# Altium schematic symbol library IC_Maxim.SchLib: 843 symbols (part 17 of 20) (continued)
## MAX8543EEE (continued)
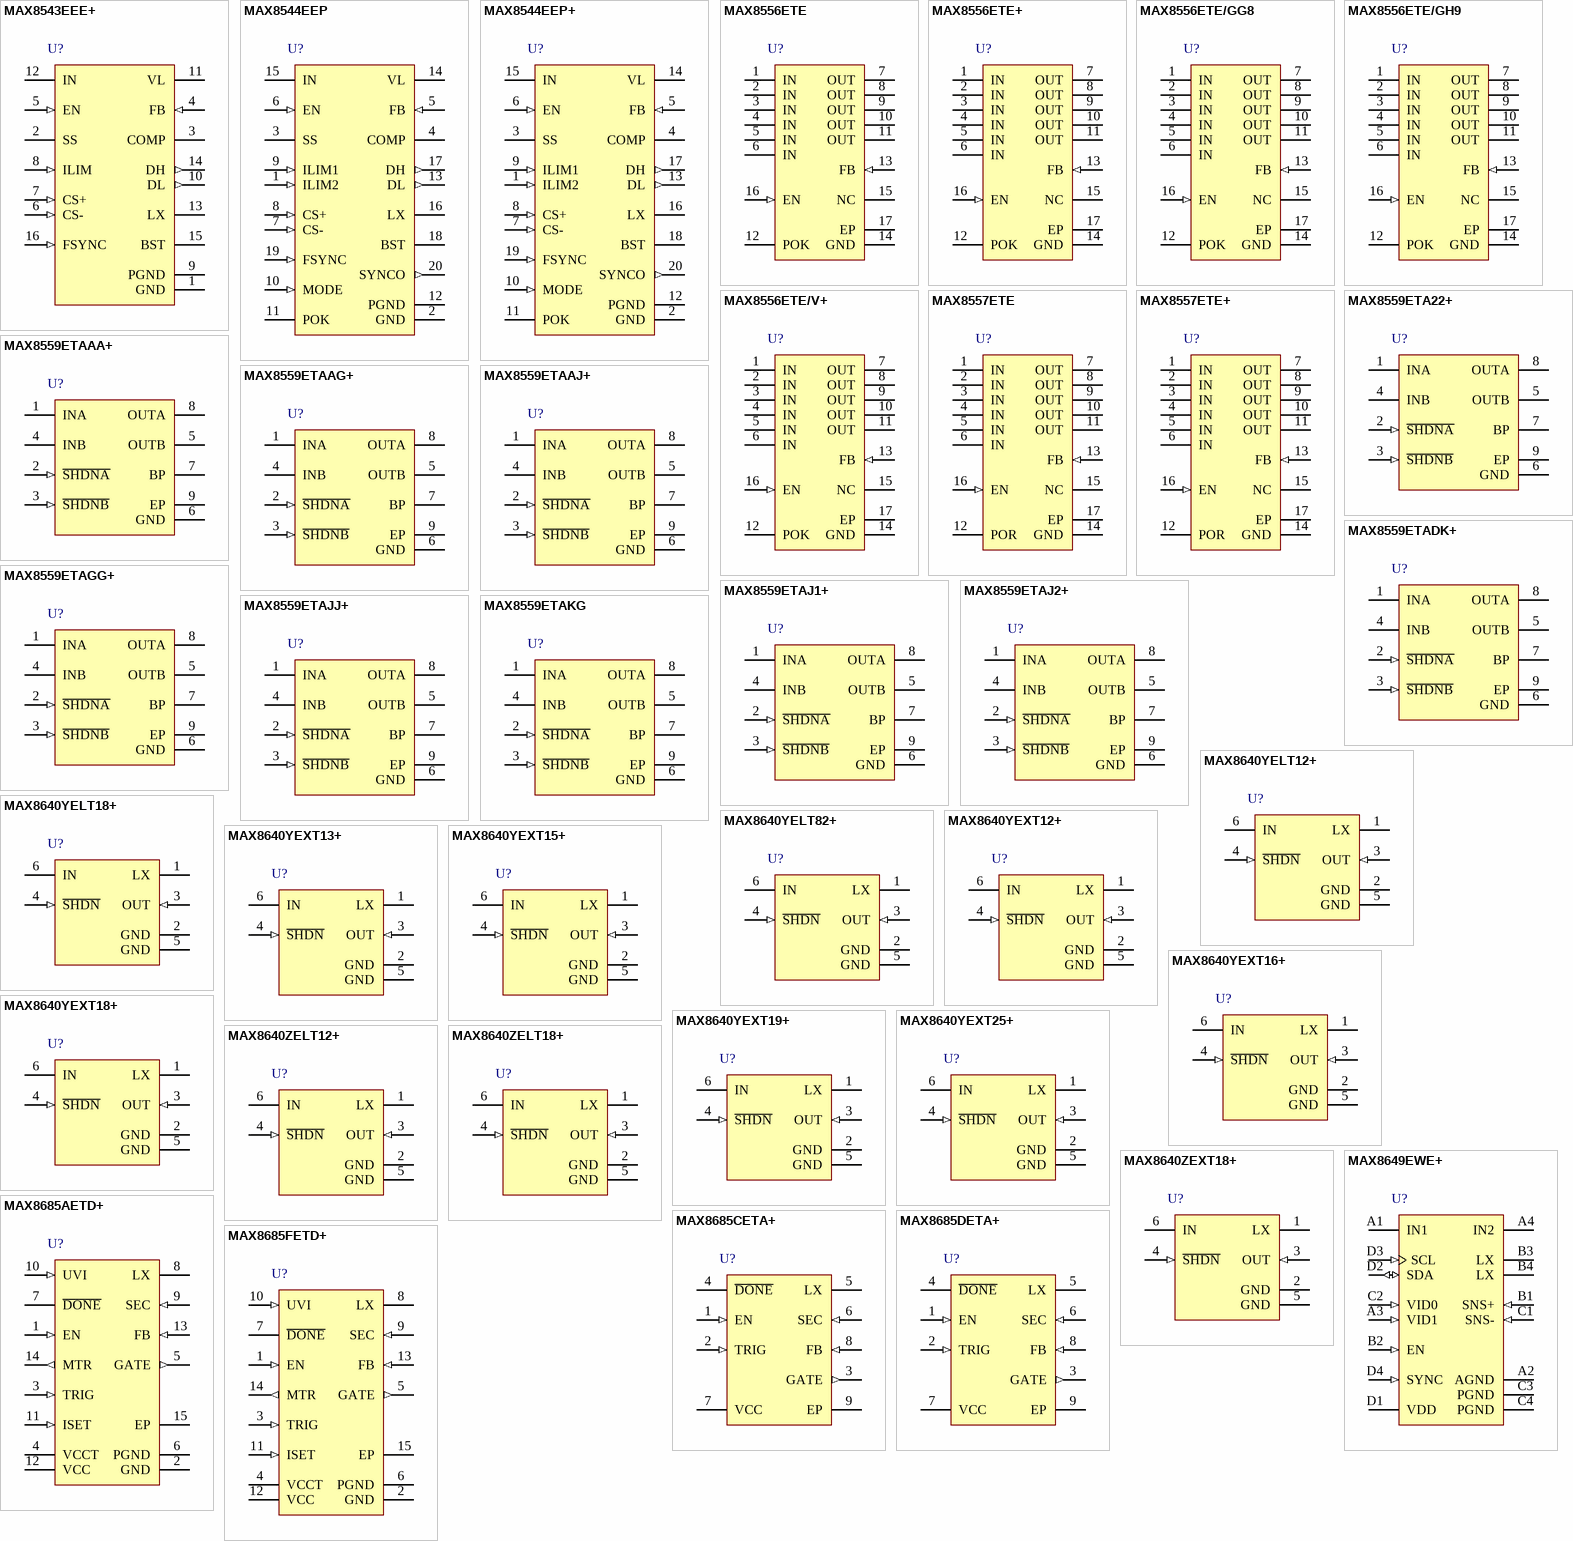
[diagram p18: symbols MAX8543EEE+ to MAX8685FETD+]

## MAX8543EEE+
designator U?
Step-Down Controllers with Prebias Startup, Lossless Sensing, Synchronization, and OVP, 16-Pin QSOP, -40癈 to +85癈, Pb-Free; DatasheetVersion: Rev 0, May-2004; PackageVersion: revJ, 2009; PackageReference: E16+1; PackageDescription: 16-Pin Quarter Small-Outline Package (QSOP) 0.150" Width, 0.025" Pitch, Pb-Free; Code_JEDEC: MO-137-AB; ComponentLink1Description: Manufacturer URL; ComponentLink1URL: http://www.maxim-ic.com; ComponentLink2Description: Datasheet; ComponentLink2URL: http://datasheets.maxim-ic.com/en/ds/MAX8543-MAX8544.pdf; ComponentLink3Description: Package Specification; ComponentLink3URL: http://pdfserv.maxim-ic.com/package_dwgs/21-0055.PDF
footprint SSOP16_0.635 (Footprint not found)
pins: 1 GND (power), 2 SS, 3 COMP, 4 FB (in), 5 EN (in), 6 CS- (in), 7 CS+ (in), 8 ILIM (in), 9 PGND (power), 10 DL (out), 11 VL (power), 12 IN (power), 13 LX, 14 DH (out), 15 BST, 16 FSYNC (in)

## MAX8544EEP
designator U?
Step-Down Controllers with Prebias Startup, Lossless Sensing, Synchronization, and OVP, 20-Pin QSOP, -40癈 to +85癈; DatasheetVersion: Rev 0, May-2004; PackageVersion: revJ, 2009; PackageReference: E20-1; PackageDescription: 20-Pin Quarter Small-Outline Package (QSOP) 0.150" Width, 0.025" Pitch; Code_JEDEC: MO-137-AD; ComponentLink1Description: Manufacturer URL; ComponentLink1URL: http://www.maxim-ic.com; ComponentLink2Description: Datasheet; ComponentLink2URL: http://datasheets.maxim-ic.com/en/ds/MAX8543-MAX8544.pdf; ComponentLink3Description: Package Specification; ComponentLink3URL: http://pdfserv.maxim-ic.com/package_dwgs/21-0055.PDF
footprint SSOP20_0.635 (Footprint not found)
pins: 1 ILIM2 (in), 2 GND (power), 3 SS, 4 COMP, 5 FB (in), 6 EN (in), 7 CS- (in), 8 CS+ (in), 9 ILIM1 (in), 10 MODE (in), 11 POK (oc), 12 PGND (power), 13 DL (out), 14 VL (power), 15 IN (power), 16 LX, 17 DH (out), 18 BST, 19 FSYNC (in), 20 SYNCO (out)

## MAX8544EEP+
designator U?
Step-Down Controllers with Prebias Startup, Lossless Sensing, Synchronization, and OVP, 20-Pin QSOP, -40癈 to +85癈, Pb-Free; DatasheetVersion: Rev 0, May-2004; PackageVersion: revJ, 2009; PackageReference: E20+1; PackageDescription: 20-Pin Quarter Small-Outline Package (QSOP) 0.150" Width, 0.025" Pitch, Pb-Free; Code_JEDEC: MO-137-AD; ComponentLink1Description: Manufacturer URL; ComponentLink1URL: http://www.maxim-ic.com; ComponentLink2Description: Datasheet; ComponentLink2URL: http://datasheets.maxim-ic.com/en/ds/MAX8543-MAX8544.pdf; ComponentLink3Description: Package Specification; ComponentLink3URL: http://pdfserv.maxim-ic.com/package_dwgs/21-0055.PDF
footprint SSOP20_0.635 (Footprint not found)
pins: 1 ILIM2 (in), 2 GND (power), 3 SS, 4 COMP, 5 FB (in), 6 EN (in), 7 CS- (in), 8 CS+ (in), 9 ILIM1 (in), 10 MODE (in), 11 POK (oc), 12 PGND (power), 13 DL (out), 14 VL (power), 15 IN (power), 16 LX, 17 DH (out), 18 BST, 19 FSYNC (in), 20 SYNCO (out)

## MAX8556ETE
designator U?
4A Ultra-Low-Input-Voltage LDO Regulator, 16-Pin QFN-EP, -40癈 to +85癈; DatasheetVersion: Rev 2, Aug-2009; PackageVersion: revO, 2011; PackageReference: T1655-3; PackageDescription: 16-Pin Thin Quad Flatpack, No Leads, 5 x 5 x 0.75 mm Body, 0.8 mm Pitch, TQFN; Code_JEDEC: MO-220WHHB; ComponentLink1Description: Manufacturer URL; ComponentLink1URL: http://www.maxim-ic.com; ComponentLink2Description: Datasheet; ComponentLink2URL: http://datasheets.maxim-ic.com/en/ds/MAX8556-MAX8557.pdf; ComponentLink3Description: Package Specification; ComponentLink3URL: http://pdfserv.maxim-ic.com/package_dwgs/21-0140.PDF
footprint QFN16_0.8-PAD(5X5) (Footprint not found)
pins: 1 IN (power), 2 IN (power), 3 IN (power), 4 IN (power), 5 IN (power), 6 IN (power), 7 OUT (power), 8 OUT (power), 9 OUT (power), 10 OUT (power), 11 OUT (power), 12 POK (oc), 13 FB (in), 14 GND (power), 15 NC, 16 EN (in), 17 EP (power)

## MAX8556ETE+
designator U?
4A Ultra-Low-Input-Voltage LDO Regulator, 16-Pin QFN-EP, -40癈 to +85癈, Pb-Free; DatasheetVersion: Rev 2, Aug-2009; PackageVersion: revO, 2011; PackageReference: T1655+3; PackageDescription: 16-Pin Thin Quad Flatpack, No Leads, 5 x 5 x 0.75 mm Body, 0.8 mm Pitch, TQFN, Pb-Free; Code_JEDEC: MO-220WHHB; ComponentLink1Description: Manufacturer URL; ComponentLink1URL: http://www.maxim-ic.com; ComponentLink2Description: Datasheet; ComponentLink2URL: http://datasheets.maxim-ic.com/en/ds/MAX8556-MAX8557.pdf; ComponentLink3Description: Package Specification; ComponentLink3URL: http://pdfserv.maxim-ic.com/package_dwgs/21-0140.PDF
footprint QFN16_0.8-PAD(5X5) (Footprint not found)
pins: 1 IN (power), 2 IN (power), 3 IN (power), 4 IN (power), 5 IN (power), 6 IN (power), 7 OUT (power), 8 OUT (power), 9 OUT (power), 10 OUT (power), 11 OUT (power), 12 POK (oc), 13 FB (in), 14 GND (power), 15 NC, 16 EN (in), 17 EP (power)

## MAX8556ETE/GG8
designator U?
4A Ultra-Low-Input-Voltage LDO Regulator, 16-Pin QFN-EP, -40癈 to +85癈; DatasheetVersion: Rev 2, Aug-2009; PackageVersion: revO, 2011; PackageReference: T1655-3; PackageDescription: 16-Pin Thin Quad Flatpack, No Leads, 5 x 5 x 0.75 mm Body, 0.8 mm Pitch, TQFN; Code_JEDEC: MO-220WHHB; ComponentLink1Description: Manufacturer URL; ComponentLink1URL: http://www.maxim-ic.com; ComponentLink2Description: Datasheet; ComponentLink2URL: http://datasheets.maxim-ic.com/en/ds/MAX8556-MAX8557.pdf; ComponentLink3Description: Package Specification; ComponentLink3URL: http://pdfserv.maxim-ic.com/package_dwgs/21-0140.PDF
footprint QFN16_0.8-PAD(5X5) (Footprint not found)
pins: 1 IN (power), 2 IN (power), 3 IN (power), 4 IN (power), 5 IN (power), 6 IN (power), 7 OUT (power), 8 OUT (power), 9 OUT (power), 10 OUT (power), 11 OUT (power), 12 POK (oc), 13 FB (in), 14 GND (power), 15 NC, 16 EN (in), 17 EP (power)

## MAX8556ETE/GH9
designator U?
4A Ultra-Low-Input-Voltage LDO Regulator, 16-Pin QFN-EP, -40癈 to +85癈; DatasheetVersion: Rev 2, Aug-2009; PackageVersion: revO, 2011; PackageReference: T1655-3; PackageDescription: 16-Pin Thin Quad Flatpack, No Leads, 5 x 5 x 0.75 mm Body, 0.8 mm Pitch, TQFN; Code_JEDEC: MO-220WHHB; ComponentLink1Description: Manufacturer URL; ComponentLink1URL: http://www.maxim-ic.com; ComponentLink2Description: Datasheet; ComponentLink2URL: http://datasheets.maxim-ic.com/en/ds/MAX8556-MAX8557.pdf; ComponentLink3Description: Package Specification; ComponentLink3URL: http://pdfserv.maxim-ic.com/package_dwgs/21-0140.PDF
footprint QFN16_0.8-PAD(5X5) (Footprint not found)
pins: 1 IN (power), 2 IN (power), 3 IN (power), 4 IN (power), 5 IN (power), 6 IN (power), 7 OUT (power), 8 OUT (power), 9 OUT (power), 10 OUT (power), 11 OUT (power), 12 POK (oc), 13 FB (in), 14 GND (power), 15 NC, 16 EN (in), 17 EP (power)

## MAX8556ETE/V+
designator U?
4A Ultra-Low-Input-Voltage LDO Regulator, Automotive Qualified, 16-Pin QFN-EP, -40癈 to +85癈, Pb-Free; DatasheetVersion: Rev 2, Aug-2009; PackageVersion: revO, 2011; PackageReference: T1655+3; PackageDescription: 16-Pin Thin Quad Flatpack, No Leads, 5 x 5 x 0.75 mm Body, 0.8 mm Pitch, TQFN, Pb-Free; Code_JEDEC: MO-220WHHB; ComponentLink1Description: Manufacturer URL; ComponentLink1URL: http://www.maxim-ic.com; ComponentLink2Description: Datasheet; ComponentLink2URL: http://datasheets.maxim-ic.com/en/ds/MAX8556-MAX8557.pdf; ComponentLink3Description: Package Specification; ComponentLink3URL: http://pdfserv.maxim-ic.com/package_dwgs/21-0140.PDF
footprint QFN16_0.8-PAD(5X5) (Footprint not found)
pins: 1 IN (power), 2 IN (power), 3 IN (power), 4 IN (power), 5 IN (power), 6 IN (power), 7 OUT (power), 8 OUT (power), 9 OUT (power), 10 OUT (power), 11 OUT (power), 12 POK (oc), 13 FB (in), 14 GND (power), 15 NC, 16 EN (in), 17 EP (power)

## MAX8557ETE
designator U?
4A Ultra-Low-Input-Voltage LDO Regulator, 16-Pin QFN-EP, -40癈 to +85癈; DatasheetVersion: Rev 2, Aug-2009; PackageVersion: revO, 2011; PackageReference: T1655-3; PackageDescription: 16-Pin Thin Quad Flatpack, No Leads, 5 x 5 x 0.75 mm Body, 0.8 mm Pitch, TQFN; Code_JEDEC: MO-220WHHB; ComponentLink1Description: Manufacturer URL; ComponentLink1URL: http://www.maxim-ic.com; ComponentLink2Description: Datasheet; ComponentLink2URL: http://datasheets.maxim-ic.com/en/ds/MAX8556-MAX8557.pdf; ComponentLink3Description: Package Specification; ComponentLink3URL: http://pdfserv.maxim-ic.com/package_dwgs/21-0140.PDF
footprint QFN16_0.8-PAD(5X5) (Footprint not found)
pins: 1 IN (power), 2 IN (power), 3 IN (power), 4 IN (power), 5 IN (power), 6 IN (power), 7 OUT (power), 8 OUT (power), 9 OUT (power), 10 OUT (power), 11 OUT (power), 12 POR (oc), 13 FB (in), 14 GND (power), 15 NC, 16 EN (in), 17 EP (power)

## MAX8557ETE+
designator U?
4A Ultra-Low-Input-Voltage LDO Regulator, 16-Pin QFN-EP, -40癈 to +85癈, Pb-Free; DatasheetVersion: Rev 2, Aug-2009; PackageVersion: revO, 2011; PackageReference: T1655+3; PackageDescription: 16-Pin Thin Quad Flatpack, No Leads, 5 x 5 x 0.75 mm Body, 0.8 mm Pitch, TQFN, Pb-Free; Code_JEDEC: MO-220WHHB; ComponentLink1Description: Manufacturer URL; ComponentLink1URL: http://www.maxim-ic.com; ComponentLink2Description: Datasheet; ComponentLink2URL: http://datasheets.maxim-ic.com/en/ds/MAX8556-MAX8557.pdf; ComponentLink3Description: Package Specification; ComponentLink3URL: http://pdfserv.maxim-ic.com/package_dwgs/21-0140.PDF
footprint QFN16_0.8-PAD(5X5) (Footprint not found)
pins: 1 IN (power), 2 IN (power), 3 IN (power), 4 IN (power), 5 IN (power), 6 IN (power), 7 OUT (power), 8 OUT (power), 9 OUT (power), 10 OUT (power), 11 OUT (power), 12 POR (oc), 13 FB (in), 14 GND (power), 15 NC, 16 EN (in), 17 EP (power)

## MAX8559ETA22+
designator U?
Dual, 300mA, Low-Noise Linear Regulator with Independent Shutdown, 8-Pin TDFN-EP, -40癈 to +85癈, Pb-Free; DatasheetVersion: Rev 2, Aug-2005; PackageVersion: revJ, 2009; PackageReference: T833+2; PackageDescription: 8-Pin Plastic Very Very Thin Dual Flatpack No Leads, Exposed Pad, 3 x 3 x 0.8 mm Body, TDFN-EP, Pb-Free; Code_JEDEC: MO-229-WEEC; ComponentLink1Description: Manufacturer URL; ComponentLink1URL: http://www.maxim-ic.com; ComponentLink2Description: Datasheet; ComponentLink2URL: http://datasheets.maxim-ic.com/en/ds/MAX8559.pdf; ComponentLink3Description: Package Specification; ComponentLink3URL: http://pdfserv.maxim-ic.com/package_dwgs/21-0137.PDF
footprint DFN8_0.65-PAD(3X3) (Footprint not found)
pins: 1 INA (power), 2 ~{SHDNA} (in), 3 ~{SHDNB} (in), 4 INB (power), 5 OUTB (power), 6 GND (power), 7 BP, 8 OUTA (power), 9 EP (power)

## MAX8559ETAAA+
designator U?
Dual, 300mA, Low-Noise Linear Regulator with Independent Shutdown, 8-Pin TDFN-EP, -40癈 to +85癈, Pb-Free; DatasheetVersion: Rev 2, Aug-2005; PackageVersion: revJ, 2009; PackageReference: T833+2; PackageDescription: 8-Pin Plastic Very Very Thin Dual Flatpack No Leads, Exposed Pad, 3 x 3 x 0.8 mm Body, TDFN-EP, Pb-Free; Code_JEDEC: MO-229-WEEC; ComponentLink1Description: Manufacturer URL; ComponentLink1URL: http://www.maxim-ic.com; ComponentLink2Description: Datasheet; ComponentLink2URL: http://datasheets.maxim-ic.com/en/ds/MAX8559.pdf; ComponentLink3Description: Package Specification; ComponentLink3URL: http://pdfserv.maxim-ic.com/package_dwgs/21-0137.PDF
footprint DFN8_0.65-PAD(3X3) (Footprint not found)
pins: 1 INA (power), 2 ~{SHDNA} (in), 3 ~{SHDNB} (in), 4 INB (power), 5 OUTB (power), 6 GND (power), 7 BP, 8 OUTA (power), 9 EP (power)

## MAX8559ETAAG+
designator U?
Dual, 300mA, Low-Noise Linear Regulator with Independent Shutdown, 8-Pin TDFN-EP, -40癈 to +85癈, Pb-Free; DatasheetVersion: Rev 2, Aug-2005; PackageVersion: revJ, 2009; PackageReference: T833+2; PackageDescription: 8-Pin Plastic Very Very Thin Dual Flatpack No Leads, Exposed Pad, 3 x 3 x 0.8 mm Body, TDFN-EP, Pb-Free; Code_JEDEC: MO-229-WEEC; ComponentLink1Description: Manufacturer URL; ComponentLink1URL: http://www.maxim-ic.com; ComponentLink2Description: Datasheet; ComponentLink2URL: http://datasheets.maxim-ic.com/en/ds/MAX8559.pdf; ComponentLink3Description: Package Specification; ComponentLink3URL: http://pdfserv.maxim-ic.com/package_dwgs/21-0137.PDF
footprint DFN8_0.65-PAD(3X3) (Footprint not found)
pins: 1 INA (power), 2 ~{SHDNA} (in), 3 ~{SHDNB} (in), 4 INB (power), 5 OUTB (power), 6 GND (power), 7 BP, 8 OUTA (power), 9 EP (power)

## MAX8559ETAAJ+
designator U?
Dual, 300mA, Low-Noise Linear Regulator with Independent Shutdown, 8-Pin TDFN-EP, -40癈 to +85癈, Pb-Free; DatasheetVersion: Rev 2, Aug-2005; PackageVersion: revJ, 2009; PackageReference: T833+2; PackageDescription: 8-Pin Plastic Very Very Thin Dual Flatpack No Leads, Exposed Pad, 3 x 3 x 0.8 mm Body, TDFN-EP, Pb-Free; Code_JEDEC: MO-229-WEEC; ComponentLink1Description: Manufacturer URL; ComponentLink1URL: http://www.maxim-ic.com; ComponentLink2Description: Datasheet; ComponentLink2URL: http://datasheets.maxim-ic.com/en/ds/MAX8559.pdf; ComponentLink3Description: Package Specification; ComponentLink3URL: http://pdfserv.maxim-ic.com/package_dwgs/21-0137.PDF
footprint DFN8_0.65-PAD(3X3) (Footprint not found)
pins: 1 INA (power), 2 ~{SHDNA} (in), 3 ~{SHDNB} (in), 4 INB (power), 5 OUTB (power), 6 GND (power), 7 BP, 8 OUTA (power), 9 EP (power)

## MAX8559ETADK+
designator U?
Dual, 300mA, Low-Noise Linear Regulator with Independent Shutdown, 8-Pin TDFN-EP, -40癈 to +85癈, Pb-Free; DatasheetVersion: Rev 2, Aug-2005; PackageVersion: revJ, 2009; PackageReference: T833+2; PackageDescription: 8-Pin Plastic Very Very Thin Dual Flatpack No Leads, Exposed Pad, 3 x 3 x 0.8 mm Body, TDFN-EP, Pb-Free; Code_JEDEC: MO-229-WEEC; ComponentLink1Description: Manufacturer URL; ComponentLink1URL: http://www.maxim-ic.com; ComponentLink2Description: Datasheet; ComponentLink2URL: http://datasheets.maxim-ic.com/en/ds/MAX8559.pdf; ComponentLink3Description: Package Specification; ComponentLink3URL: http://pdfserv.maxim-ic.com/package_dwgs/21-0137.PDF
footprint DFN8_0.65-PAD(3X3) (Footprint not found)
pins: 1 INA (power), 2 ~{SHDNA} (in), 3 ~{SHDNB} (in), 4 INB (power), 5 OUTB (power), 6 GND (power), 7 BP, 8 OUTA (power), 9 EP (power)

## MAX8559ETAGG+
designator U?
Dual, 300mA, Low-Noise Linear Regulator with Independent Shutdown, 8-Pin TDFN-EP, -40癈 to +85癈, Pb-Free; DatasheetVersion: Rev 2, Aug-2005; PackageVersion: revJ, 2009; PackageReference: T833+2; PackageDescription: 8-Pin Plastic Very Very Thin Dual Flatpack No Leads, Exposed Pad, 3 x 3 x 0.8 mm Body, TDFN-EP, Pb-Free; Code_JEDEC: MO-229-WEEC; ComponentLink1Description: Manufacturer URL; ComponentLink1URL: http://www.maxim-ic.com; ComponentLink2Description: Datasheet; ComponentLink2URL: http://datasheets.maxim-ic.com/en/ds/MAX8559.pdf; ComponentLink3Description: Package Specification; ComponentLink3URL: http://pdfserv.maxim-ic.com/package_dwgs/21-0137.PDF
footprint DFN8_0.65-PAD(3X3) (Footprint not found)
pins: 1 INA (power), 2 ~{SHDNA} (in), 3 ~{SHDNB} (in), 4 INB (power), 5 OUTB (power), 6 GND (power), 7 BP, 8 OUTA (power), 9 EP (power)

## MAX8559ETAJ1+
designator U?
Dual, 300mA, Low-Noise Linear Regulator with Independent Shutdown, 8-Pin TDFN-EP, -40癈 to +85癈, Pb-Free; DatasheetVersion: Rev 2, Aug-2005; PackageVersion: revJ, 2009; PackageReference: T833+2; PackageDescription: 8-Pin Plastic Very Very Thin Dual Flatpack No Leads, Exposed Pad, 3 x 3 x 0.8 mm Body, TDFN-EP, Pb-Free; Code_JEDEC: MO-229-WEEC; ComponentLink1Description: Manufacturer URL; ComponentLink1URL: http://www.maxim-ic.com; ComponentLink2Description: Datasheet; ComponentLink2URL: http://datasheets.maxim-ic.com/en/ds/MAX8559.pdf; ComponentLink3Description: Package Specification; ComponentLink3URL: http://pdfserv.maxim-ic.com/package_dwgs/21-0137.PDF
footprint DFN8_0.65-PAD(3X3) (Footprint not found)
pins: 1 INA (power), 2 ~{SHDNA} (in), 3 ~{SHDNB} (in), 4 INB (power), 5 OUTB (power), 6 GND (power), 7 BP, 8 OUTA (power), 9 EP (power)

## MAX8559ETAJ2+
designator U?
Dual, 300mA, Low-Noise Linear Regulator with Independent Shutdown, 8-Pin TDFN-EP, -40癈 to +85癈, Pb-Free; DatasheetVersion: Rev 2, Aug-2005; PackageVersion: revJ, 2009; PackageReference: T833+2; PackageDescription: 8-Pin Plastic Very Very Thin Dual Flatpack No Leads, Exposed Pad, 3 x 3 x 0.8 mm Body, TDFN-EP, Pb-Free; Code_JEDEC: MO-229-WEEC; ComponentLink1Description: Manufacturer URL; ComponentLink1URL: http://www.maxim-ic.com; ComponentLink2Description: Datasheet; ComponentLink2URL: http://datasheets.maxim-ic.com/en/ds/MAX8559.pdf; ComponentLink3Description: Package Specification; ComponentLink3URL: http://pdfserv.maxim-ic.com/package_dwgs/21-0137.PDF
footprint DFN8_0.65-PAD(3X3) (Footprint not found)
pins: 1 INA (power), 2 ~{SHDNA} (in), 3 ~{SHDNB} (in), 4 INB (power), 5 OUTB (power), 6 GND (power), 7 BP, 8 OUTA (power), 9 EP (power)

## MAX8559ETAJJ+
designator U?
Dual, 300mA, Low-Noise Linear Regulator with Independent Shutdown, 8-Pin TDFN-EP, -40癈 to +85癈, Pb-Free; DatasheetVersion: Rev 2, Aug-2005; PackageVersion: revJ, 2009; PackageReference: T833+2; PackageDescription: 8-Pin Plastic Very Very Thin Dual Flatpack No Leads, Exposed Pad, 3 x 3 x 0.8 mm Body, TDFN-EP, Pb-Free; Code_JEDEC: MO-229-WEEC; ComponentLink1Description: Manufacturer URL; ComponentLink1URL: http://www.maxim-ic.com; ComponentLink2Description: Datasheet; ComponentLink2URL: http://datasheets.maxim-ic.com/en/ds/MAX8559.pdf; ComponentLink3Description: Package Specification; ComponentLink3URL: http://pdfserv.maxim-ic.com/package_dwgs/21-0137.PDF
footprint DFN8_0.65-PAD(3X3) (Footprint not found)
pins: 1 INA (power), 2 ~{SHDNA} (in), 3 ~{SHDNB} (in), 4 INB (power), 5 OUTB (power), 6 GND (power), 7 BP, 8 OUTA (power), 9 EP (power)

## MAX8559ETAKG
designator U?
Dual, 300mA, Low-Noise Linear Regulator with Independent Shutdown, 8-Pin TDFN-EP, -40癈 to +85癈; DatasheetVersion: Rev 2, Aug-2005; PackageVersion: revJ, 2009; PackageReference: T833-2; PackageDescription: 8-Pin Plastic Very Very Thin Dual Flatpack No Leads, Exposed Pad, 3 x 3 x 0.8 mm Body, TDFN-EP; Code_JEDEC: MO-229-WEEC; ComponentLink1Description: Manufacturer URL; ComponentLink1URL: http://www.maxim-ic.com; ComponentLink2Description: Datasheet; ComponentLink2URL: http://datasheets.maxim-ic.com/en/ds/MAX8559.pdf; ComponentLink3Description: Package Specification; ComponentLink3URL: http://pdfserv.maxim-ic.com/package_dwgs/21-0137.PDF
footprint DFN8_0.65-PAD(3X3) (Footprint not found)
pins: 1 INA (power), 2 ~{SHDNA} (in), 3 ~{SHDNB} (in), 4 INB (power), 5 OUTB (power), 6 GND (power), 7 BP, 8 OUTA (power), 9 EP (power)

## MAX8640YELT12+
designator U?
Tiny 500mA, 4MHz/2MHz Synchronous Step-Down DC-DC Converter, 1.2V output, 2.2uH L1, 6-Pin DFN, -40癈 to +85癈, Pb-Free; DatasheetVersion: Rev 4, Feb-2009; PackageVersion: revG, 2012; PackageReference: L611+1; PackageDescription: 6-Pin Micro Dual Flatpack No Lead, 1.5 x 1 x 0.8 mm Body, 0.5 mm Pitch, uDFN; ComponentLink1Description: Manufacturer URL; ComponentLink1URL: http://www.maxim-ic.com; ComponentLink2Description: Datasheet; ComponentLink2URL: http://datasheets.maxim-ic.com/en/ds/MAX8640Y-MAX8640Z.pdf; ComponentLink3Description: Package Specification; ComponentLink3URL: http://pdfserv.maxim-ic.com/package_dwgs/21-0147.PDF
footprint DFN6_0.5(1.5X1) (Footprint not found)
pins: 1 LX, 2 GND (power), 3 OUT (in), 4 ~{SHDN} (in), 5 GND (power), 6 IN (power)

## MAX8640YELT18+
designator U?
Tiny 500mA, 4MHz/2MHz Synchronous Step-Down DC-DC Converter, 1.8V output, 2.2uH L1, 6-Pin DFN, -40癈 to +85癈, Pb-Free; DatasheetVersion: Rev 4, Feb-2009; PackageVersion: revG, 2012; PackageReference: L611+1; PackageDescription: 6-Pin Micro Dual Flatpack No Lead, 1.5 x 1 x 0.8 mm Body, 0.5 mm Pitch, uDFN; ComponentLink1Description: Manufacturer URL; ComponentLink1URL: http://www.maxim-ic.com; ComponentLink2Description: Datasheet; ComponentLink2URL: http://datasheets.maxim-ic.com/en/ds/MAX8640Y-MAX8640Z.pdf; ComponentLink3Description: Package Specification; ComponentLink3URL: http://pdfserv.maxim-ic.com/package_dwgs/21-0147.PDF
footprint DFN6_0.5(1.5X1) (Footprint not found)
pins: 1 LX, 2 GND (power), 3 OUT (in), 4 ~{SHDN} (in), 5 GND (power), 6 IN (power)

## MAX8640YELT82+
designator U?
Tiny 500mA, 4MHz/2MHz Synchronous Step-Down DC-DC Converter, 2.85V output, 2.2uH L1, 6-Pin DFN, -40癈 to +85癈, Pb-Free; DatasheetVersion: Rev 4, Feb-2009; PackageVersion: revG, 2012; PackageReference: L611+1; PackageDescription: 6-Pin Micro Dual Flatpack No Lead, 1.5 x 1 x 0.8 mm Body, 0.5 mm Pitch, uDFN; ComponentLink1Description: Manufacturer URL; ComponentLink1URL: http://www.maxim-ic.com; ComponentLink2Description: Datasheet; ComponentLink2URL: http://datasheets.maxim-ic.com/en/ds/MAX8640Y-MAX8640Z.pdf; ComponentLink3Description: Package Specification; ComponentLink3URL: http://pdfserv.maxim-ic.com/package_dwgs/21-0147.PDF
footprint DFN6_0.5(1.5X1) (Footprint not found)
pins: 1 LX, 2 GND (power), 3 OUT (in), 4 ~{SHDN} (in), 5 GND (power), 6 IN (power)

## MAX8640YEXT12+
designator U?
Tiny 500mA, 4MHz/2MHz Synchronous Step-Down DC-DC Converter, 1.2V output, 2.2uH L1, 6-Pin SC70, -40癈 to +85癈, Pb-Free; DatasheetVersion: Rev 4, Feb-2009; PackageVersion: revH, 2010; PackageReference: X6SN+1; PackageDescription: 6-Pin SL70 Package 2 x 1.3 mm Body ,0.65 mm Pitch, Pb-Free; Code_JEDEC: MO-203; ComponentLink1Description: Manufacturer URL; ComponentLink1URL: http://www.maxim-ic.com; ComponentLink2Description: Datasheet; ComponentLink2URL: http://datasheets.maxim-ic.com/en/ds/MAX8640Y-MAX8640Z.pdf; ComponentLink3Description: Package Specification; ComponentLink3URL: http://pdfserv.maxim-ic.com/package_dwgs/21-0077.PDF
footprint SOT363 (Footprint not found)
pins: 1 LX, 2 GND (power), 3 OUT (in), 4 ~{SHDN} (in), 5 GND (power), 6 IN (power)

## MAX8640YEXT13+
designator U?
Tiny 500mA, 4MHz/2MHz Synchronous Step-Down DC-DC Converter, 1.3V output, 2.2uH L1, 6-Pin SC70, -40癈 to +85癈, Pb-Free; DatasheetVersion: Rev 4, Feb-2009; PackageVersion: revH, 2010; PackageReference: X6SN+1; PackageDescription: 6-Pin SL70 Package 2 x 1.3 mm Body ,0.65 mm Pitch, Pb-Free; Code_JEDEC: MO-203; ComponentLink1Description: Manufacturer URL; ComponentLink1URL: http://www.maxim-ic.com; ComponentLink2Description: Datasheet; ComponentLink2URL: http://datasheets.maxim-ic.com/en/ds/MAX8640Y-MAX8640Z.pdf; ComponentLink3Description: Package Specification; ComponentLink3URL: http://pdfserv.maxim-ic.com/package_dwgs/21-0077.PDF
footprint SOT363 (Footprint not found)
pins: 1 LX, 2 GND (power), 3 OUT (in), 4 ~{SHDN} (in), 5 GND (power), 6 IN (power)

## MAX8640YEXT15+
designator U?
Tiny 500mA, 4MHz/2MHz Synchronous Step-Down DC-DC Converter, 1.5V output, 2.2uH L1, 6-Pin SC70, -40癈 to +85癈, Pb-Free; DatasheetVersion: Rev 4, Feb-2009; PackageVersion: revH, 2010; PackageReference: X6SN+1; PackageDescription: 6-Pin SL70 Package 2 x 1.3 mm Body ,0.65 mm Pitch, Pb-Free; Code_JEDEC: MO-203; ComponentLink1Description: Manufacturer URL; ComponentLink1URL: http://www.maxim-ic.com; ComponentLink2Description: Datasheet; ComponentLink2URL: http://datasheets.maxim-ic.com/en/ds/MAX8640Y-MAX8640Z.pdf; ComponentLink3Description: Package Specification; ComponentLink3URL: http://pdfserv.maxim-ic.com/package_dwgs/21-0077.PDF
footprint SOT363 (Footprint not found)
pins: 1 LX, 2 GND (power), 3 OUT (in), 4 ~{SHDN} (in), 5 GND (power), 6 IN (power)

## MAX8640YEXT16+
designator U?
Tiny 500mA, 4MHz/2MHz Synchronous Step-Down DC-DC Converter, 1.6V output, 2.2uH L1, 6-Pin SC70, -40癈 to +85癈, Pb-Free; DatasheetVersion: Rev 4, Feb-2009; PackageVersion: revH, 2010; PackageReference: X6SN+1; PackageDescription: 6-Pin SL70 Package 2 x 1.3 mm Body ,0.65 mm Pitch, Pb-Free; Code_JEDEC: MO-203; ComponentLink1Description: Manufacturer URL; ComponentLink1URL: http://www.maxim-ic.com; ComponentLink2Description: Datasheet; ComponentLink2URL: http://datasheets.maxim-ic.com/en/ds/MAX8640Y-MAX8640Z.pdf; ComponentLink3Description: Package Specification; ComponentLink3URL: http://pdfserv.maxim-ic.com/package_dwgs/21-0077.PDF
footprint SOT363 (Footprint not found)
pins: 1 LX, 2 GND (power), 3 OUT (in), 4 ~{SHDN} (in), 5 GND (power), 6 IN (power)

## MAX8640YEXT18+
designator U?
Tiny 500mA, 4MHz/2MHz Synchronous Step-Down DC-DC Converter, 1.8V output, 2.2uH L1, 6-Pin SC70, -40癈 to +85癈, Pb-Free; DatasheetVersion: Rev 4, Feb-2009; PackageVersion: revH, 2010; PackageReference: X6SN+1; PackageDescription: 6-Pin SL70 Package 2 x 1.3 mm Body ,0.65 mm Pitch, Pb-Free; Code_JEDEC: MO-203; ComponentLink1Description: Manufacturer URL; ComponentLink1URL: http://www.maxim-ic.com; ComponentLink2Description: Datasheet; ComponentLink2URL: http://datasheets.maxim-ic.com/en/ds/MAX8640Y-MAX8640Z.pdf; ComponentLink3Description: Package Specification; ComponentLink3URL: http://pdfserv.maxim-ic.com/package_dwgs/21-0077.PDF
footprint SOT363 (Footprint not found)
pins: 1 LX, 2 GND (power), 3 OUT (in), 4 ~{SHDN} (in), 5 GND (power), 6 IN (power)

## MAX8640YEXT19+
designator U?
Tiny 500mA, 4MHz/2MHz Synchronous Step-Down DC-DC Converter, 1.9V output, 2.2uH L1, 6-Pin SC70, -40癈 to +85癈, Pb-Free; DatasheetVersion: Rev 4, Feb-2009; PackageVersion: revH, 2010; PackageReference: X6SN+1; PackageDescription: 6-Pin SL70 Package 2 x 1.3 mm Body ,0.65 mm Pitch, Pb-Free; Code_JEDEC: MO-203; ComponentLink1Description: Manufacturer URL; ComponentLink1URL: http://www.maxim-ic.com; ComponentLink2Description: Datasheet; ComponentLink2URL: http://datasheets.maxim-ic.com/en/ds/MAX8640Y-MAX8640Z.pdf; ComponentLink3Description: Package Specification; ComponentLink3URL: http://pdfserv.maxim-ic.com/package_dwgs/21-0077.PDF
footprint SOT363 (Footprint not found)
pins: 1 LX, 2 GND (power), 3 OUT (in), 4 ~{SHDN} (in), 5 GND (power), 6 IN (power)

## MAX8640YEXT25+
designator U?
Tiny 500mA, 4MHz/2MHz Synchronous Step-Down DC-DC Converter, 2.5V output, 2.2uH L1, 6-Pin SC70, -40癈 to +85癈, Pb-Free; DatasheetVersion: Rev 4, Feb-2009; PackageVersion: revH, 2010; PackageReference: X6SN+1; PackageDescription: 6-Pin SL70 Package 2 x 1.3 mm Body ,0.65 mm Pitch, Pb-Free; Code_JEDEC: MO-203; ComponentLink1Description: Manufacturer URL; ComponentLink1URL: http://www.maxim-ic.com; ComponentLink2Description: Datasheet; ComponentLink2URL: http://datasheets.maxim-ic.com/en/ds/MAX8640Y-MAX8640Z.pdf; ComponentLink3Description: Package Specification; ComponentLink3URL: http://pdfserv.maxim-ic.com/package_dwgs/21-0077.PDF
footprint SOT363 (Footprint not found)
pins: 1 LX, 2 GND (power), 3 OUT (in), 4 ~{SHDN} (in), 5 GND (power), 6 IN (power)

## MAX8640ZELT12+
designator U?
Tiny 500mA, 4MHz/2MHz Synchronous Step-Down DC-DC Converter, 1.2V output, 1uH L1, 6-Pin DFN, -40癈 to +85癈, Pb-Free; DatasheetVersion: Rev 4, Feb-2009; PackageVersion: revG, 2012; PackageReference: L611+1; PackageDescription: 6-Pin Micro Dual Flatpack No Lead, 1.5 x 1 x 0.8 mm Body, 0.5 mm Pitch, uDFN; ComponentLink1Description: Manufacturer URL; ComponentLink1URL: http://www.maxim-ic.com; ComponentLink2Description: Datasheet; ComponentLink2URL: http://datasheets.maxim-ic.com/en/ds/MAX8640Y-MAX8640Z.pdf; ComponentLink3Description: Package Specification; ComponentLink3URL: http://pdfserv.maxim-ic.com/package_dwgs/21-0147.PDF
footprint DFN6_0.5(1.5X1) (Footprint not found)
pins: 1 LX, 2 GND (power), 3 OUT (in), 4 ~{SHDN} (in), 5 GND (power), 6 IN (power)

## MAX8640ZELT18+
designator U?
Tiny 500mA, 4MHz/2MHz Synchronous Step-Down DC-DC Converter, 1.8V output, 1uH L1, 6-Pin DFN, -40癈 to +85癈, Pb-Free; DatasheetVersion: Rev 4, Feb-2009; PackageVersion: revG, 2012; PackageReference: L611+1; PackageDescription: 6-Pin Micro Dual Flatpack No Lead, 1.5 x 1 x 0.8 mm Body, 0.5 mm Pitch, uDFN; ComponentLink1Description: Manufacturer URL; ComponentLink1URL: http://www.maxim-ic.com; ComponentLink2Description: Datasheet; ComponentLink2URL: http://datasheets.maxim-ic.com/en/ds/MAX8640Y-MAX8640Z.pdf; ComponentLink3Description: Package Specification; ComponentLink3URL: http://pdfserv.maxim-ic.com/package_dwgs/21-0147.PDF
footprint DFN6_0.5(1.5X1) (Footprint not found)
pins: 1 LX, 2 GND (power), 3 OUT (in), 4 ~{SHDN} (in), 5 GND (power), 6 IN (power)

## MAX8640ZEXT18+
designator U?
Tiny 500mA, 4MHz/2MHz Synchronous Step-Down DC-DC Converter, 1.8V output, 1uH L1, 6-Pin SC70, -40癈 to +85癈, Pb-Free; DatasheetVersion: Rev 4, Feb-2009; PackageVersion: revH, 2010; PackageReference: X6SN+1; PackageDescription: 6-Pin SL70 Package 2 x 1.3 mm Body ,0.65 mm Pitch, Pb-Free; Code_JEDEC: MO-203; ComponentLink1Description: Manufacturer URL; ComponentLink1URL: http://www.maxim-ic.com; ComponentLink2Description: Datasheet; ComponentLink2URL: http://datasheets.maxim-ic.com/en/ds/MAX8640Y-MAX8640Z.pdf; ComponentLink3Description: Package Specification; ComponentLink3URL: http://pdfserv.maxim-ic.com/package_dwgs/21-0077.PDF
footprint SOT363 (Footprint not found)
pins: 1 LX, 2 GND (power), 3 OUT (in), 4 ~{SHDN} (in), 5 GND (power), 6 IN (power)

## MAX8649EWE+
designator U?
1.8A Step-Down Regulator with Remote Sense, I2C Address (0xC0/0xC1), 16-Pin WLP, -40癈 to +85癈, Pb-Free; DatasheetVersion: Rev 4, Jun-2011; PackageVersion: revF, 2011; PackageReference: W162B2+1; PackageDescription: 16-Ball Wafer-Level Package (WLP) 4x4 Bump, Full Array, 0.5 mm Pitch, Pb-Free; ComponentLink1Description: Manufacturer URL; ComponentLink1URL: http://www.maxim-ic.com; ComponentLink2Description: Datasheet; ComponentLink2URL: http://datasheets.maxim-ic.com/en/ds/MAX8649-MAX8649A.pdf; ComponentLink3Description: Package Specification; ComponentLink3URL: http://pdfserv.maxim-ic.com/package_dwgs/21-0200.PDF
footprint BGA16_0.5(2X2) (Footprint not found)
pins: A1 IN1 (power), A2 AGND (power), A3 VID1 (in), A4 IN2 (power), B1 SNS+ (in), B2 EN (in), B3 LX, B4 LX, C1 SNS- (in), C2 VID0 (in), C3 PGND (power), C4 PGND (power), D1 VDD (power), D2 SDA (io), D3 SCL (in), D4 SYNC (in)

## MAX8685AETD+
designator U?
Xenon Photoflash Charger with IGBT Driver and Voltage Monitor, 14-Pin TDFN-EP, -40癈 to +85癈, Pb-Free; DatasheetVersion: Rev 4, Feb-2009; PackageVersion: revJ, 2009; PackageReference: T1433+2; PackageDescription: 14-Pin Plastic Very Very Thin Dual Flatpack No Leads (TDFN-EP), 3 x 3 x 0.8 mm Body, 0.4 mm Pitch, Pb-Free; ComponentLink1Description: Manufacturer URL; ComponentLink1URL: http://www.maxim-ic.com; ComponentLink2Description: Datasheet; ComponentLink2URL: http://datasheets.maxim-ic.com/en/ds/MAX8685-MAX8685F.pdf; ComponentLink3Description: Package Specification; ComponentLink3URL: http://pdfserv.maxim-ic.com/package_dwgs/21-0137.PDF
footprint DFN14_0.4-PAD(3X3) (Footprint not found)
pins: 1 EN (in), 2 GND (power), 3 TRIG (in), 4 VCCT (power), 5 GATE (out), 6 PGND (power), 7 ~{DONE} (oc), 8 LX, 9 SEC (in), 10 UVI (in), 11 ISET (in), 12 VCC (power), 13 FB (in), 14 MTR (out), 15 EP (power)

## MAX8685CETA+
designator U?
Xenon Photoflash Charger with IGBT Driver and Voltage Monitor, 8-Pin TDFN, -40癈 to +85癈, Pb-Free; DatasheetVersion: Rev 4, Feb-2009; PackageVersion: revC, 2011; PackageReference: T823+1; PackageDescription: 8-Pin Plastic Very Very Thin Dual Flatpack No Leads, Exposed Pad, 2 x 3 x 0.8 mm Body, TDFN-EP, Pb-Free; Code_JEDEC: MO-229-WCED-2; ComponentLink1Description: Manufacturer URL; ComponentLink1URL: http://www.maxim-ic.com; ComponentLink2Description: Datasheet; ComponentLink2URL: http://datasheets.maxim-ic.com/en/ds/MAX8685-MAX8685F.pdf; ComponentLink3Description: Package Specification; ComponentLink3URL: http://pdfserv.maxim-ic.com/package_dwgs/21-0174.PDF
footprint DFN8_0.5-PAD(3X2) (Footprint not found)
pins: 1 EN (in), 2 TRIG (in), 3 GATE (out), 4 ~{DONE} (oc), 5 LX, 6 SEC (in), 7 VCC (power), 8 FB (in), 9 EP (power)

## MAX8685DETA+
designator U?
Xenon Photoflash Charger with IGBT Driver and Voltage Monitor, 8-Pin TDFN, -40癈 to +85癈, Pb-Free; DatasheetVersion: Rev 4, Feb-2009; PackageVersion: revC, 2011; PackageReference: T823+1; PackageDescription: 8-Pin Plastic Very Very Thin Dual Flatpack No Leads, Exposed Pad, 2 x 3 x 0.8 mm Body, TDFN-EP, Pb-Free; Code_JEDEC: MO-229-WCED-2; ComponentLink1Description: Manufacturer URL; ComponentLink1URL: http://www.maxim-ic.com; ComponentLink2Description: Datasheet; ComponentLink2URL: http://datasheets.maxim-ic.com/en/ds/MAX8685-MAX8685F.pdf; ComponentLink3Description: Package Specification; ComponentLink3URL: http://pdfserv.maxim-ic.com/package_dwgs/21-0174.PDF
footprint DFN8_0.5-PAD(3X2) (Footprint not found)
pins: 1 EN (in), 2 TRIG (in), 3 GATE (out), 4 ~{DONE} (oc), 5 LX, 6 SEC (in), 7 VCC (power), 8 FB (in), 9 EP (power)

## MAX8685FETD+
designator U?
Xenon Photoflash Charger with IGBT Driver and Voltage Monitor, 14-Pin TDFN-EP, -40癈 to +85癈, Pb-Free; DatasheetVersion: Rev 4, Feb-2009; PackageVersion: revJ, 2009; PackageReference: T1433+2; PackageDescription: 14-Pin Plastic Very Very Thin Dual Flatpack No Leads (TDFN-EP), 3 x 3 x 0.8 mm Body, 0.4 mm Pitch, Pb-Free; ComponentLink1Description: Manufacturer URL; ComponentLink1URL: http://www.maxim-ic.com; ComponentLink2Description: Datasheet; ComponentLink2URL: http://datasheets.maxim-ic.com/en/ds/MAX8685-MAX8685F.pdf; ComponentLink3Description: Package Specification; ComponentLink3URL: http://pdfserv.maxim-ic.com/package_dwgs/21-0137.PDF
footprint DFN14_0.4-PAD(3X3) (Footprint not found)
pins: 1 EN (in), 2 GND (power), 3 TRIG (in), 4 VCCT (power), 5 GATE (out), 6 PGND (power), 7 ~{DONE} (oc), 8 LX, 9 SEC (in), 10 UVI (in), 11 ISET (in), 12 VCC (power), 13 FB (in), 14 MTR (out), 15 EP (power)
